# Altium footprint library con-samtec.PCBLIB: 805 footprints (part 3 of 55)
Each footprint in its own frame and in the unit in brackets; x right, y up, seen from the top. Pads: shape width x height; smd on the part's side, far side on the other; paste and mask are expansions set on the pad; w line width, h text height; cw(c..) or ccw(c..) is an arc to the next point about the centre after c.
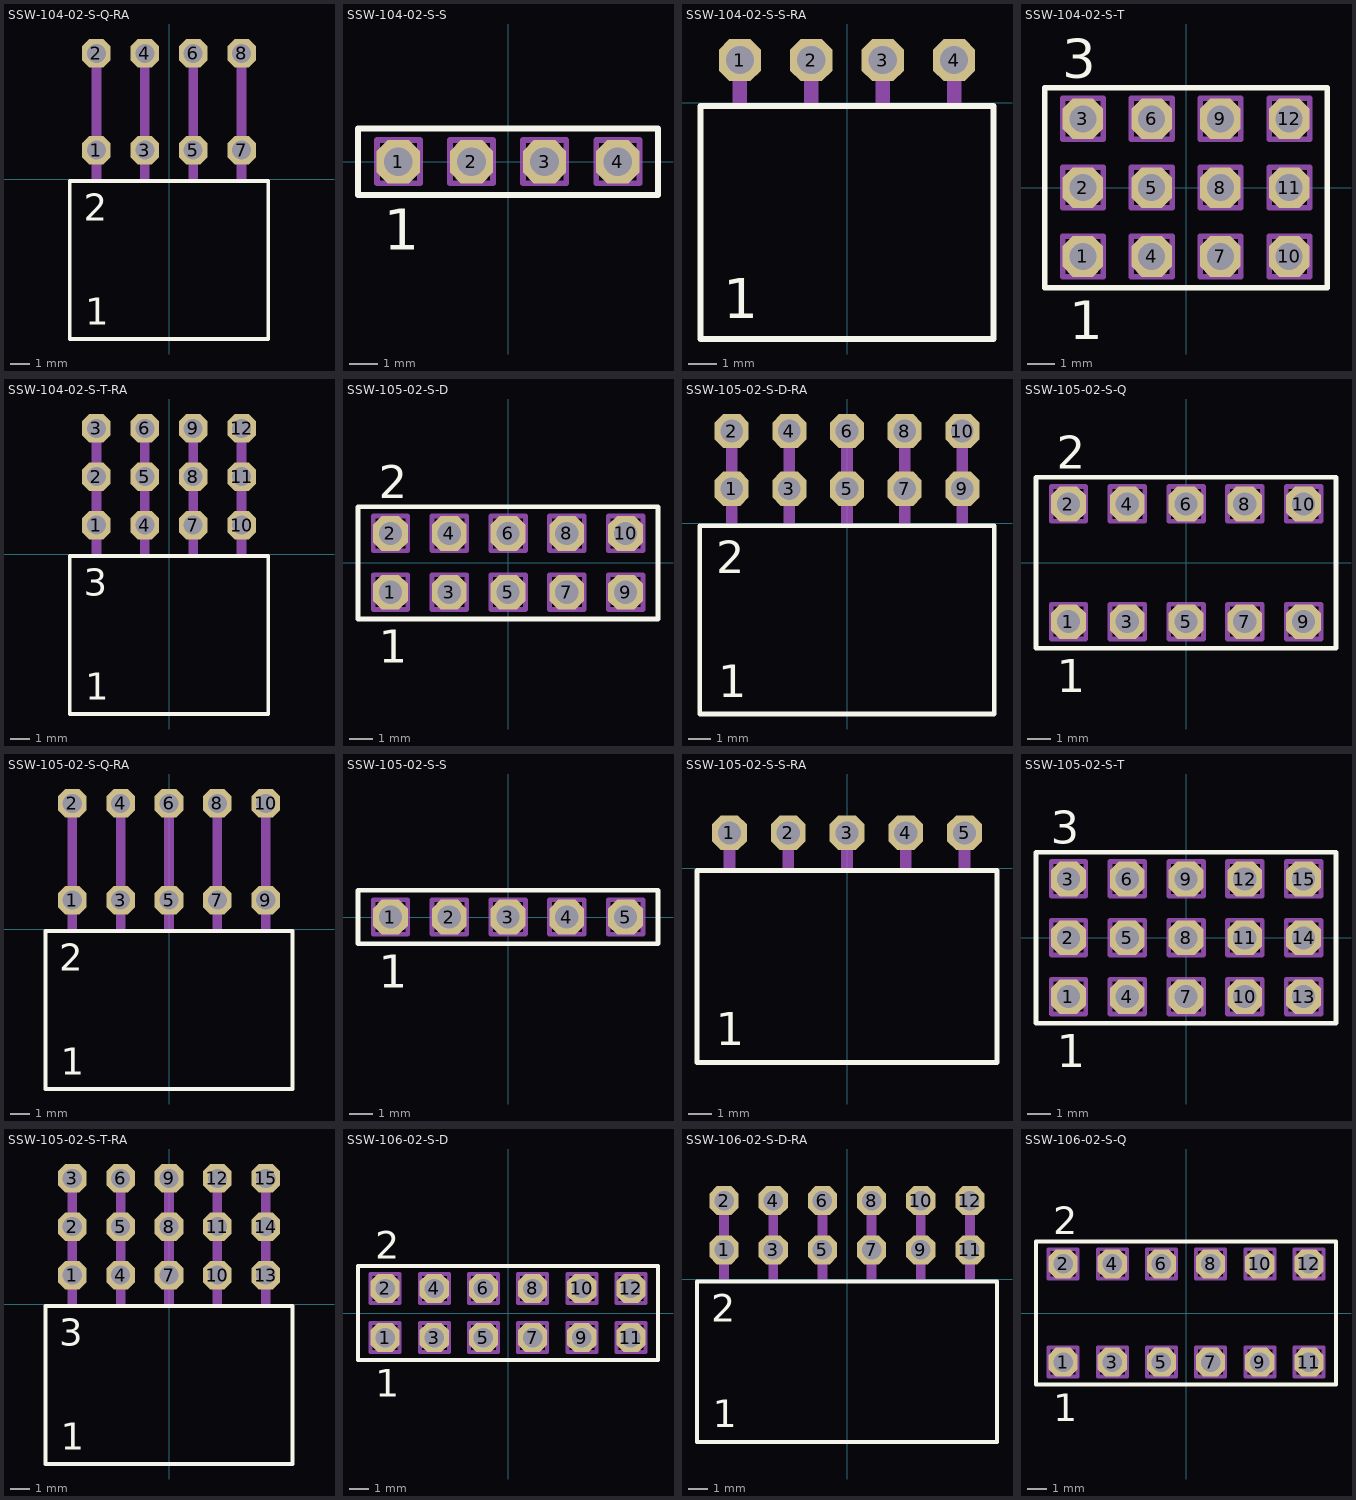
[diagram p2: the footprints below, top view; thin cyan lines are the x and y axes]

## SSW-104-02-S-Q-RA [mil]
pads (8):
  oct 59.06x59.06 hole 39.37: 1(-150,60) 2(-150,260) 3(-50,60) 4(-50,260) 5(50,60) 6(50,260) 7(150,60) 8(150,260)
Top Overlay:
  lines w8: -205.08,-330.55 205.08,-330.55 205.08,-4.17 -205.08,-4.17 -205.08,-330.55
  text "1" at -173.43,-301.18 h56.1
  text "2" at -176.38,-86.61 h56.1
Mechanical 16:
  rectangle: -160,0 -140,270
  rectangle: -60,0 -40,270
  rectangle: 40,0 60,270
  rectangle: 140,0 160,270

## SSW-104-02-S-S [mm]
pads (4):
  oct 1.5x1.5 hole 1: 1(-3.81,0) 2(-1.27,0) 3(1.27,0) 4(3.81,0)
Top Overlay:
  lines w0.203: -5.209,-1.155 5.209,-1.155 5.209,1.155 -5.209,1.155 -5.209,-1.155
  text "1" at -4.318,-3.048 h1.42
Mechanical 16:
  lines w0.203: -4.555,-0.745 -3.055,-0.745 -3.055,0.755 -4.555,0.755 -4.555,-0.745 ; -2.015,-0.745 -0.515,-0.745 -0.515,0.755 -2.015,0.755 -2.015,-0.745 ; 0.525,-0.745 2.025,-0.745 2.025,0.755 0.525,0.755 0.525,-0.745 ; 3.065,-0.745 4.565,-0.745 4.565,0.755 3.065,0.755 3.065,-0.745

## SSW-104-02-S-S-RA [mil]
pads (4):
  oct 59.06x59.06 hole 39.37: 1(-150,60) 2(-50,60) 3(50,60) 4(150,60)
Top Overlay:
  lines w8: -205.08,-330.55 205.08,-330.55 205.08,-4.17 -205.08,-4.17 -205.08,-330.55
  text "1" at -173.43,-301.18 h56.1
Mechanical 16:
  rectangle: -160,0 -140,70
  rectangle: -60,0 -40,70
  rectangle: 40,0 60,70
  rectangle: 140,0 160,70

## SSW-104-02-S-T [mm]
pads (12):
  oct 1.5x1.5 hole 1: 1(-3.81,-2.54) 2(-3.81,0) 3(-3.81,2.54) 4(-1.27,-2.54) 5(-1.27,0) 6(-1.27,2.54) 7(1.27,-2.54) 8(1.27,0) 9(1.27,2.54) 10(3.81,-2.54) 11(3.81,0) 12(3.81,2.54)
Top Overlay:
  lines w0.203: -5.209,-3.695 5.209,-3.695 5.209,3.695 -5.209,3.695 -5.209,-3.695
  text "1" at -4.318,-5.588 h1.42
  text "3" at -4.572,4.064 h1.42
Mechanical 16:
  lines w0.203: -4.555,-3.285 -3.055,-3.285 -3.055,-1.785 -4.555,-1.785 -4.555,-3.285 ; -4.555,-0.745 -3.055,-0.745 -3.055,0.755 -4.555,0.755 -4.555,-0.745 ; -4.555,1.795 -3.055,1.795 -3.055,3.295 -4.555,3.295 -4.555,1.795 ; -2.015,-3.285 -0.515,-3.285 -0.515,-1.785 -2.015,-1.785 -2.015,-3.285 ; -2.015,-0.745 -0.515,-0.745 -0.515,0.755 -2.015,0.755 -2.015,-0.745 ; -2.015,1.795 -0.515,1.795 -0.515,3.295 -2.015,3.295 -2.015,1.795 ; 0.525,-3.285 2.025,-3.285 2.025,-1.785 0.525,-1.785 0.525,-3.285 ; 0.525,-0.745 2.025,-0.745 2.025,0.755 0.525,0.755 0.525,-0.745 ; 0.525,1.795 2.025,1.795 2.025,3.295 0.525,3.295 0.525,1.795 ; 3.065,-3.285 4.565,-3.285 4.565,-1.785 3.065,-1.785 3.065,-3.285 ; 3.065,-0.745 4.565,-0.745 4.565,0.755 3.065,0.755 3.065,-0.745 ; 3.065,1.795 4.565,1.795 4.565,3.295 3.065,3.295 3.065,1.795

## SSW-104-02-S-T-RA [mil]
pads (12):
  oct 59.06x59.06 hole 39.37: 1(-150,60) 2(-150,160) 3(-150,260) 4(-50,60) 5(-50,160) 6(-50,260) 7(50,60) 8(50,160) 9(50,260) 10(150,60) 11(150,160) 12(150,260)
Top Overlay:
  lines w8: -205.08,-330.55 205.08,-330.55 205.08,-4.17 -205.08,-4.17 -205.08,-330.55
  text "1" at -173.43,-301.18 h56.1
  text "3" at -176.38,-86.61 h56.1
Mechanical 16:
  rectangle: -160,0 -140,270
  rectangle: -60,0 -40,270
  rectangle: 40,0 60,270
  rectangle: 140,0 160,270

## SSW-105-02-S-D [mm]
pads (10):
  oct 1.5x1.5 hole 1: 1(-5.08,-1.27) 2(-5.08,1.27) 3(-2.54,-1.27) 4(-2.54,1.27) 5(0,-1.27) 6(0,1.27) 7(2.54,-1.27) 8(2.54,1.27) 9(5.08,-1.27) 10(5.08,1.27)
Top Overlay:
  lines w0.203: -6.479,-2.425 6.479,-2.425 6.479,2.425 -6.479,2.425 -6.479,-2.425
  text "1" at -5.588,-4.318 h1.42
  text "2" at -5.588,2.794 h1.42
Mechanical 16:
  lines w0.203: -5.825,-2.015 -4.325,-2.015 -4.325,-0.515 -5.825,-0.515 -5.825,-2.015 ; -5.825,0.525 -4.325,0.525 -4.325,2.025 -5.825,2.025 -5.825,0.525 ; -3.285,-2.015 -1.785,-2.015 -1.785,-0.515 -3.285,-0.515 -3.285,-2.015 ; -3.285,0.525 -1.785,0.525 -1.785,2.025 -3.285,2.025 -3.285,0.525 ; -0.745,-2.015 0.755,-2.015 0.755,-0.515 -0.745,-0.515 -0.745,-2.015 ; -0.745,0.525 0.755,0.525 0.755,2.025 -0.745,2.025 -0.745,0.525 ; 1.795,-2.015 3.295,-2.015 3.295,-0.515 1.795,-0.515 1.795,-2.015 ; 1.795,0.525 3.295,0.525 3.295,2.025 1.795,2.025 1.795,0.525 ; 4.335,-2.015 5.835,-2.015 5.835,-0.515 4.335,-0.515 4.335,-2.015 ; 4.335,0.525 5.835,0.525 5.835,2.025 4.335,2.025 4.335,0.525

## SSW-105-02-S-D-RA [mil]
pads (10):
  oct 59.06x59.06 hole 39.37: 1(-200,60) 2(-200,160) 3(-100,60) 4(-100,160) 5(0,60) 6(0,160) 7(100,60) 8(100,160) 9(200,60) 10(200,160)
Top Overlay:
  lines w8: -255.08,-330.55 255.08,-330.55 255.08,-4.17 -255.08,-4.17 -255.08,-330.55
  text "1" at -223.43,-301.18 h56.1
  text "2" at -226.38,-86.61 h56.1
Mechanical 16:
  rectangle: -210,0 -190,170
  rectangle: -110,0 -90,170
  rectangle: -10,0 10,170
  rectangle: 90,0 110,170
  rectangle: 190,0 210,170

## SSW-105-02-S-Q [mm]
pads (10):
  oct 1.5x1.5 hole 1: 1(-5.08,-2.54) 2(-5.08,2.54) 3(-2.54,-2.54) 4(-2.54,2.54) 5(0,-2.54) 6(0,2.54) 7(2.54,-2.54) 8(2.54,2.54) 9(5.08,-2.54) 10(5.08,2.54)
Top Overlay:
  lines w0.203: -6.479,-3.695 6.479,-3.695 6.479,3.695 -6.479,3.695 -6.479,-3.695
  text "1" at -5.588,-5.588 h1.42
  text "2" at -5.588,4.064 h1.42
Mechanical 16:
  lines w0.203: -5.825,-3.285 -4.325,-3.285 -4.325,-1.785 -5.825,-1.785 -5.825,-3.285 ; -5.825,1.795 -4.325,1.795 -4.325,3.295 -5.825,3.295 -5.825,1.795 ; -3.285,-3.285 -1.785,-3.285 -1.785,-1.785 -3.285,-1.785 -3.285,-3.285 ; -3.285,1.795 -1.785,1.795 -1.785,3.295 -3.285,3.295 -3.285,1.795 ; -0.745,-3.285 0.755,-3.285 0.755,-1.785 -0.745,-1.785 -0.745,-3.285 ; -0.745,1.795 0.755,1.795 0.755,3.295 -0.745,3.295 -0.745,1.795 ; 1.795,-3.285 3.295,-3.285 3.295,-1.785 1.795,-1.785 1.795,-3.285 ; 1.795,1.795 3.295,1.795 3.295,3.295 1.795,3.295 1.795,1.795 ; 4.335,-3.285 5.835,-3.285 5.835,-1.785 4.335,-1.785 4.335,-3.285 ; 4.335,1.795 5.835,1.795 5.835,3.295 4.335,3.295 4.335,1.795

## SSW-105-02-S-Q-RA [mil]
pads (10):
  oct 59.06x59.06 hole 39.37: 1(-200,60) 2(-200,260) 3(-100,60) 4(-100,260) 5(0,60) 6(0,260) 7(100,60) 8(100,260) 9(200,60) 10(200,260)
Top Overlay:
  lines w8: -255.08,-330.55 255.08,-330.55 255.08,-4.17 -255.08,-4.17 -255.08,-330.55
  text "1" at -223.43,-301.18 h56.1
  text "2" at -226.38,-86.61 h56.1
Mechanical 16:
  rectangle: -210,0 -190,270
  rectangle: -110,0 -90,270
  rectangle: -10,0 10,270
  rectangle: 90,0 110,270
  rectangle: 190,0 210,270

## SSW-105-02-S-S [mm]
pads (5):
  oct 1.5x1.5 hole 1: 1(-5.08,0) 2(-2.54,0) 3(0,0) 4(2.54,0) 5(5.08,0)
Top Overlay:
  lines w0.203: -6.479,-1.155 6.479,-1.155 6.479,1.155 -6.479,1.155 -6.479,-1.155
  text "1" at -5.588,-3.048 h1.42
Mechanical 16:
  lines w0.203: -5.825,-0.745 -4.325,-0.745 -4.325,0.755 -5.825,0.755 -5.825,-0.745 ; -3.285,-0.745 -1.785,-0.745 -1.785,0.755 -3.285,0.755 -3.285,-0.745 ; -0.745,-0.745 0.755,-0.745 0.755,0.755 -0.745,0.755 -0.745,-0.745 ; 1.795,-0.745 3.295,-0.745 3.295,0.755 1.795,0.755 1.795,-0.745 ; 4.335,-0.745 5.835,-0.745 5.835,0.755 4.335,0.755 4.335,-0.745

## SSW-105-02-S-S-RA [mil]
pads (5):
  oct 59.06x59.06 hole 39.37: 1(-200,60) 2(-100,60) 3(0,60) 4(100,60) 5(200,60)
Top Overlay:
  lines w8: -255.08,-330.55 255.08,-330.55 255.08,-4.17 -255.08,-4.17 -255.08,-330.55
  text "1" at -223.43,-301.18 h56.1
Mechanical 16:
  rectangle: -210,0 -190,70
  rectangle: -110,0 -90,70
  rectangle: -10,0 10,70
  rectangle: 90,0 110,70
  rectangle: 190,0 210,70

## SSW-105-02-S-T [mm]
pads (15):
  oct 1.5x1.5 hole 1: 1(-5.08,-2.54) 2(-5.08,0) 3(-5.08,2.54) 4(-2.54,-2.54) 5(-2.54,0) 6(-2.54,2.54) 7(0,-2.54) 8(0,0) 9(0,2.54) 10(2.54,-2.54) 11(2.54,0) 12(2.54,2.54) 13(5.08,-2.54) 14(5.08,0) 15(5.08,2.54)
Top Overlay:
  lines w0.203: -6.479,-3.695 6.479,-3.695 6.479,3.695 -6.479,3.695 -6.479,-3.695
  text "1" at -5.588,-5.588 h1.42
  text "3" at -5.842,4.064 h1.42
Mechanical 16:
  lines w0.203: -5.825,-3.285 -4.325,-3.285 -4.325,-1.785 -5.825,-1.785 -5.825,-3.285 ; -5.825,-0.745 -4.325,-0.745 -4.325,0.755 -5.825,0.755 -5.825,-0.745 ; -5.825,1.795 -4.325,1.795 -4.325,3.295 -5.825,3.295 -5.825,1.795 ; -3.285,-3.285 -1.785,-3.285 -1.785,-1.785 -3.285,-1.785 -3.285,-3.285 ; -3.285,-0.745 -1.785,-0.745 -1.785,0.755 -3.285,0.755 -3.285,-0.745 ; -3.285,1.795 -1.785,1.795 -1.785,3.295 -3.285,3.295 -3.285,1.795 ; -0.745,-3.285 0.755,-3.285 0.755,-1.785 -0.745,-1.785 -0.745,-3.285 ; -0.745,-0.745 0.755,-0.745 0.755,0.755 -0.745,0.755 -0.745,-0.745 ; -0.745,1.795 0.755,1.795 0.755,3.295 -0.745,3.295 -0.745,1.795 ; 1.795,-3.285 3.295,-3.285 3.295,-1.785 1.795,-1.785 1.795,-3.285 ; 1.795,-0.745 3.295,-0.745 3.295,0.755 1.795,0.755 1.795,-0.745 ; 1.795,1.795 3.295,1.795 3.295,3.295 1.795,3.295 1.795,1.795 ; 4.335,-3.285 5.835,-3.285 5.835,-1.785 4.335,-1.785 4.335,-3.285 ; 4.335,-0.745 5.835,-0.745 5.835,0.755 4.335,0.755 4.335,-0.745 ; 4.335,1.795 5.835,1.795 5.835,3.295 4.335,3.295 4.335,1.795

## SSW-105-02-S-T-RA [mil]
pads (15):
  oct 59.06x59.06 hole 39.37: 1(-200,60) 2(-200,160) 3(-200,260) 4(-100,60) 5(-100,160) 6(-100,260) 7(0,60) 8(0,160) 9(0,260) 10(100,60) 11(100,160) 12(100,260) 13(200,60) 14(200,160) 15(200,260)
Top Overlay:
  lines w8: -255.08,-330.55 255.08,-330.55 255.08,-4.17 -255.08,-4.17 -255.08,-330.55
  text "1" at -223.43,-301.18 h56.1
  text "3" at -226.38,-86.61 h56.1
Mechanical 16:
  rectangle: -210,0 -190,270
  rectangle: -110,0 -90,270
  rectangle: -10,0 10,270
  rectangle: 90,0 110,270
  rectangle: 190,0 210,270

## SSW-106-02-S-D [mm]
pads (12):
  oct 1.5x1.5 hole 1: 1(-6.35,-1.27) 2(-6.35,1.27) 3(-3.81,-1.27) 4(-3.81,1.27) 5(-1.27,-1.27) 6(-1.27,1.27) 7(1.27,-1.27) 8(1.27,1.27) 9(3.81,-1.27) 10(3.81,1.27) 11(6.35,-1.27) 12(6.35,1.27)
Top Overlay:
  lines w0.203: -7.749,-2.425 7.749,-2.425 7.749,2.425 -7.749,2.425 -7.749,-2.425
  text "1" at -6.858,-4.318 h1.42
  text "2" at -6.858,2.794 h1.42
Mechanical 16:
  lines w0.203: -7.095,-2.015 -5.595,-2.015 -5.595,-0.515 -7.095,-0.515 -7.095,-2.015 ; -7.095,0.525 -5.595,0.525 -5.595,2.025 -7.095,2.025 -7.095,0.525 ; -4.555,-2.015 -3.055,-2.015 -3.055,-0.515 -4.555,-0.515 -4.555,-2.015 ; -4.555,0.525 -3.055,0.525 -3.055,2.025 -4.555,2.025 -4.555,0.525 ; -2.015,-2.015 -0.515,-2.015 -0.515,-0.515 -2.015,-0.515 -2.015,-2.015 ; -2.015,0.525 -0.515,0.525 -0.515,2.025 -2.015,2.025 -2.015,0.525 ; 0.525,-2.015 2.025,-2.015 2.025,-0.515 0.525,-0.515 0.525,-2.015 ; 0.525,0.525 2.025,0.525 2.025,2.025 0.525,2.025 0.525,0.525 ; 3.065,-2.015 4.565,-2.015 4.565,-0.515 3.065,-0.515 3.065,-2.015 ; 3.065,0.525 4.565,0.525 4.565,2.025 3.065,2.025 3.065,0.525 ; 5.605,-2.015 7.105,-2.015 7.105,-0.515 5.605,-0.515 5.605,-2.015 ; 5.605,0.525 7.105,0.525 7.105,2.025 5.605,2.025 5.605,0.525

## SSW-106-02-S-D-RA [mil]
pads (12):
  oct 59.06x59.06 hole 39.37: 1(-250,60) 2(-250,160) 3(-150,60) 4(-150,160) 5(-50,60) 6(-50,160) 7(50,60) 8(50,160) 9(150,60) 10(150,160) 11(250,60) 12(250,160)
Top Overlay:
  lines w8: -305.08,-330.55 305.08,-330.55 305.08,-4.17 -305.08,-4.17 -305.08,-330.55
  text "1" at -273.43,-301.18 h56.1
  text "2" at -276.38,-86.61 h56.1
Mechanical 16:
  rectangle: -260,0 -240,170
  rectangle: -160,0 -140,170
  rectangle: -60,0 -40,170
  rectangle: 40,0 60,170
  rectangle: 140,0 160,170
  rectangle: 240,0 260,170

## SSW-106-02-S-Q [mm]
pads (12):
  oct 1.5x1.5 hole 1: 1(-6.35,-2.54) 2(-6.35,2.54) 3(-3.81,-2.54) 4(-3.81,2.54) 5(-1.27,-2.54) 6(-1.27,2.54) 7(1.27,-2.54) 8(1.27,2.54) 9(3.81,-2.54) 10(3.81,2.54) 11(6.35,-2.54) 12(6.35,2.54)
Top Overlay:
  lines w0.203: -7.749,-3.695 7.749,-3.695 7.749,3.695 -7.749,3.695 -7.749,-3.695
  text "1" at -6.858,-5.588 h1.42
  text "2" at -6.858,4.064 h1.42
Mechanical 16:
  lines w0.203: -7.095,-3.285 -5.595,-3.285 -5.595,-1.785 -7.095,-1.785 -7.095,-3.285 ; -7.095,1.795 -5.595,1.795 -5.595,3.295 -7.095,3.295 -7.095,1.795 ; -4.555,-3.285 -3.055,-3.285 -3.055,-1.785 -4.555,-1.785 -4.555,-3.285 ; -4.555,1.795 -3.055,1.795 -3.055,3.295 -4.555,3.295 -4.555,1.795 ; -2.015,-3.285 -0.515,-3.285 -0.515,-1.785 -2.015,-1.785 -2.015,-3.285 ; -2.015,1.795 -0.515,1.795 -0.515,3.295 -2.015,3.295 -2.015,1.795 ; 0.525,-3.285 2.025,-3.285 2.025,-1.785 0.525,-1.785 0.525,-3.285 ; 0.525,1.795 2.025,1.795 2.025,3.295 0.525,3.295 0.525,1.795 ; 3.065,-3.285 4.565,-3.285 4.565,-1.785 3.065,-1.785 3.065,-3.285 ; 3.065,1.795 4.565,1.795 4.565,3.295 3.065,3.295 3.065,1.795 ; 5.605,-3.285 7.105,-3.285 7.105,-1.785 5.605,-1.785 5.605,-3.285 ; 5.605,1.795 7.105,1.795 7.105,3.295 5.605,3.295 5.605,1.795